# Altium footprint library ST封装.PcbLib: 1336 footprints (part 77 of 109)
Each footprint in its own frame and in the unit in brackets; x right, y up, seen from the top. Pads: shape width x height; smd on the part's side, far side on the other; paste and mask are expansions set on the pad; w line width, h text height; cw(c..) or ccw(c..) is an arc to the next point about the centre after c.
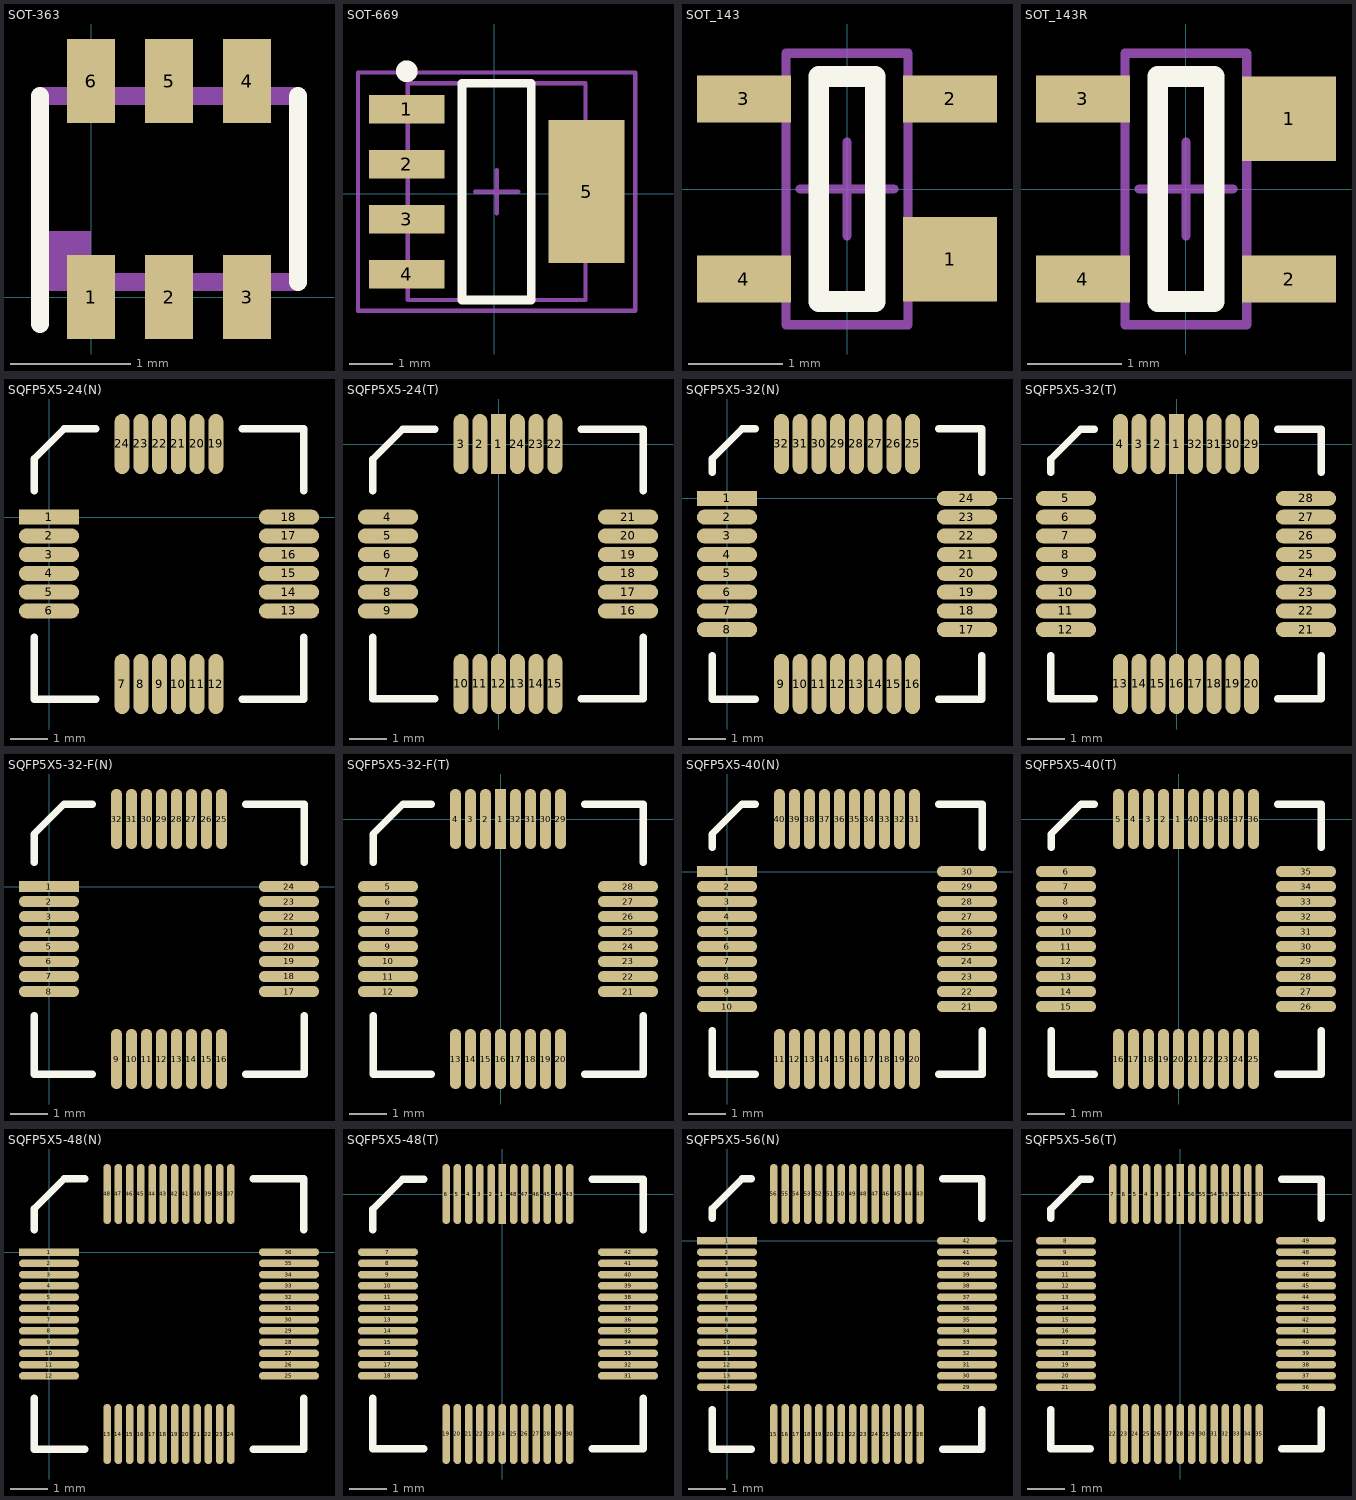
[diagram p76: the footprints below, top view; thin cyan lines are the x and y axes]

## SOT-363 [mm]
pads (6):
  rect 0.4x0.7 smd: 1(0,0) 2(0.65,0) 3(1.3,0) 4(1.3,1.8) 5(0.65,1.8) 6(0,1.8)
Top Overlay:
  lines w0.15: -0.425,-0.225 -0.425,1.675 ; 1.725,0.125 1.725,1.675
Mechanical 4:
  rectangle: -0.425,0.125 0,0.55
  lines w0.15: -0.425,0.125 -0.425,1.675 1.725,1.675 1.725,0.125 -0.425,0.125
  text ".Designator" at 0.425,1.175 h0.6

## SOT-669 [mm] "John"
pads (5):
  rect 1.75x0.65 smd: 1(-2.024,1.956) 2(-2.024,0.686) 3(-2.024,-0.584) 4(-2.024,-1.854)
  rect 1.75x3.3 smd: 5(2.126,0.051)
Top Overlay:
  circle w0.25: c-2.024,2.831 r0.125
  lines w0.2: -0.749,-2.449 0.851,-2.449 0.851,2.551 -0.749,2.551 -0.749,-2.449
Mechanical 13:
  lines w0.1: -1.999,-2.449 2.101,-2.449 2.101,2.551 -1.999,2.551 -1.999,-2.449
Mechanical 15:
  lines w0.1: -0.449,0.051 0.551,0.051 ; 0.051,-0.449 0.051,0.551 ; -3.149,-2.699 3.251,-2.699 3.251,2.801 -3.149,2.801 -3.149,-2.699
3D body "User Library-SOT669-CW.step": height 1.15, standoff -0.05, extent -2.974,-2.323 3.454,2.577

## SOT_143 [mm]
pads (4):
  rect 1x0.9 smd: 1(1.1,-0.75)
  rect 1x0.5 smd: 2(1.1,0.96) 3(-1.1,0.96) 4(-1.1,-0.96)
Top Overlay:
  lines w0.22: -0.3,-1.2 -0.3,1.2 0.3,1.2 0.3,-1.2 -0.3,-1.2
Mechanical 15:
  lines w0.1: -0.5,0 0.5,0 ; 0,-0.5 0,0.5 ; -0.65,-1.45 0.65,-1.45 0.65,1.45 -0.65,1.45 -0.65,-1.45
3D body "User Library-sot143.step": height 1, standoff 0, extent -1.22,-1.46 1.2,1.46

## SOT_143R [mm]
pads (4):
  rect 1x0.9 smd: 1(1.1,0.75)
  rect 1x0.5 smd: 2(1.1,-0.96) 3(-1.1,0.96) 4(-1.1,-0.96)
Top Overlay:
  lines w0.22: -0.3,-1.2 0.3,-1.2 0.3,1.2 -0.3,1.2 -0.3,-1.2
Mechanical 15:
  lines w0.1: -0.5,0 0.5,0 ; 0,-0.5 0,0.5 ; -0.65,-1.45 -0.65,1.45 0.65,1.45 0.65,-1.45 -0.65,-1.45
3D body "SOT-143R.STEP": height 0.95, standoff 0.02, extent -1.25,-1.45 1.25,1.45

## SQFP5X5-24(N) [mm]
pads (24):
  rect 1.6x0.4 smd: 1(0,0)
  oval 1.6x0.4 smd: 2(0,-0.5) 3(0,-1) 4(0,-1.5) 5(0,-2) 6(0,-2.5) 13(6.4,-2.5) 14(6.4,-2) 15(6.4,-1.5) 16(6.4,-1) 17(6.4,-0.5) 18(6.4,0)
  oval 0.4x1.6 smd: 7(1.95,-4.45) 8(2.45,-4.45) 9(2.95,-4.45) 10(3.45,-4.45) 11(3.95,-4.45) 12(4.45,-4.45) 19(4.45,1.95) 20(3.95,1.95) 21(3.45,1.95) 22(2.95,1.95) 23(2.45,1.95) 24(1.95,1.95)
Top Overlay:
  lines w0.2: -0.4,-3.2 -0.4,-4.85 1.25,-4.85 ; -0.4,0.7 -0.4,1.55 0.4,2.35 1.25,2.35 ; 5.15,-4.85 6.8,-4.85 6.8,-3.2 ; 5.15,2.35 6.8,2.35 6.8,0.7

## SQFP5X5-24(T) [mm]
pads (24):
  rect 0.4x1.6 smd: 1(0,0)
  oval 0.4x1.6 smd: 2(-0.5,0) 3(-1,0) 10(-1,-6.4) 11(-0.5,-6.4) 12(0,-6.4) 13(0.5,-6.4) 14(1,-6.4) 15(1.5,-6.4) 22(1.5,0) 23(1,0) 24(0.5,0)
  oval 1.6x0.4 smd: 4(-2.95,-1.95) 5(-2.95,-2.45) 6(-2.95,-2.95) 7(-2.95,-3.45) 8(-2.95,-3.95) 9(-2.95,-4.45) 16(3.45,-4.45) 17(3.45,-3.95) 18(3.45,-3.45) 19(3.45,-2.95) 20(3.45,-2.45) 21(3.45,-1.95)
Top Overlay:
  lines w0.2: -3.35,-5.15 -3.35,-6.8 -1.7,-6.8 ; -3.35,-1.25 -3.35,-0.4 -2.55,0.4 -1.7,0.4 ; 2.2,-6.8 3.85,-6.8 3.85,-5.15 ; 2.2,0.4 3.85,0.4 3.85,-1.25

## SQFP5X5-32(N) [mm]
pads (32):
  rect 1.6x0.4 smd: 1(0,0)
  oval 1.6x0.4 smd: 2(0,-0.5) 3(0,-1) 4(0,-1.5) 5(0,-2) 6(0,-2.5) 7(0,-3) 8(0,-3.5) 17(6.4,-3.5) 18(6.4,-3) 19(6.4,-2.5) 20(6.4,-2) 21(6.4,-1.5) 22(6.4,-1) 23(6.4,-0.5) 24(6.4,0)
  oval 0.4x1.6 smd: 9(1.45,-4.95) 10(1.95,-4.95) 11(2.45,-4.95) 12(2.95,-4.95) 13(3.45,-4.95) 14(3.95,-4.95) 15(4.45,-4.95) 16(4.95,-4.95) 25(4.95,1.45) 26(4.45,1.45) 27(3.95,1.45) 28(3.45,1.45) 29(2.95,1.45) 30(2.45,1.45) 31(1.95,1.45) 32(1.45,1.45)
Top Overlay:
  lines w0.2: -0.4,-4.2 -0.4,-5.35 0.75,-5.35 ; -0.4,0.7 -0.4,1.05 0.4,1.85 0.75,1.85 ; 5.65,-5.35 6.8,-5.35 6.8,-4.2 ; 5.65,1.85 6.8,1.85 6.8,0.7

## SQFP5X5-32(T) [mm]
pads (32):
  rect 0.4x1.6 smd: 1(0,0)
  oval 0.4x1.6 smd: 2(-0.5,0) 3(-1,0) 4(-1.5,0) 13(-1.5,-6.4) 14(-1,-6.4) 15(-0.5,-6.4) 16(0,-6.4) 17(0.5,-6.4) 18(1,-6.4) 19(1.5,-6.4) 20(2,-6.4) 29(2,0) 30(1.5,0) 31(1,0) 32(0.5,0)
  oval 1.6x0.4 smd: 5(-2.95,-1.45) 6(-2.95,-1.95) 7(-2.95,-2.45) 8(-2.95,-2.95) 9(-2.95,-3.45) 10(-2.95,-3.95) 11(-2.95,-4.45) 12(-2.95,-4.95) 21(3.45,-4.95) 22(3.45,-4.45) 23(3.45,-3.95) 24(3.45,-3.45) 25(3.45,-2.95) 26(3.45,-2.45) 27(3.45,-1.95) 28(3.45,-1.45)
Top Overlay:
  lines w0.2: -3.35,-5.65 -3.35,-6.8 -2.2,-6.8 ; -3.35,-0.75 -3.35,-0.4 -2.55,0.4 -2.2,0.4 ; 2.7,-6.8 3.85,-6.8 3.85,-5.65 ; 2.7,0.4 3.85,0.4 3.85,-0.75

## SQFP5X5-32-F(N) [mm]
pads (32):
  rect 1.6x0.3 smd: 1(0,0)
  oval 1.6x0.3 smd: 2(0,-0.4) 3(0,-0.8) 4(0,-1.2) 5(0,-1.6) 6(0,-2) 7(0,-2.4) 8(0,-2.8) 17(6.4,-2.8) 18(6.4,-2.4) 19(6.4,-2) 20(6.4,-1.6) 21(6.4,-1.2) 22(6.4,-0.8) 23(6.4,-0.4) 24(6.4,0)
  oval 0.3x1.6 smd: 9(1.8,-4.6) 10(2.2,-4.6) 11(2.6,-4.6) 12(3,-4.6) 13(3.4,-4.6) 14(3.8,-4.6) 15(4.2,-4.6) 16(4.6,-4.6) 25(4.6,1.8) 26(4.2,1.8) 27(3.8,1.8) 28(3.4,1.8) 29(3,1.8) 30(2.6,1.8) 31(2.2,1.8) 32(1.8,1.8)
Top Overlay:
  lines w0.2: -0.4,-3.45 -0.4,-5 1.15,-5 ; -0.4,0.65 -0.4,1.4 0.4,2.2 1.15,2.2 ; 5.25,-5 6.8,-5 6.8,-3.45 ; 5.25,2.2 6.8,2.2 6.8,0.65

## SQFP5X5-32-F(T) [mm]
pads (32):
  rect 0.3x1.6 smd: 1(0,0)
  oval 0.3x1.6 smd: 2(-0.4,0) 3(-0.8,0) 4(-1.2,0) 13(-1.2,-6.4) 14(-0.8,-6.4) 15(-0.4,-6.4) 16(0,-6.4) 17(0.4,-6.4) 18(0.8,-6.4) 19(1.2,-6.4) 20(1.6,-6.4) 29(1.6,0) 30(1.2,0) 31(0.8,0) 32(0.4,0)
  oval 1.6x0.3 smd: 5(-3,-1.8) 6(-3,-2.2) 7(-3,-2.6) 8(-3,-3) 9(-3,-3.4) 10(-3,-3.8) 11(-3,-4.2) 12(-3,-4.6) 21(3.4,-4.6) 22(3.4,-4.2) 23(3.4,-3.8) 24(3.4,-3.4) 25(3.4,-3) 26(3.4,-2.6) 27(3.4,-2.2) 28(3.4,-1.8)
Top Overlay:
  lines w0.2: -3.4,-5.25 -3.4,-6.8 -1.85,-6.8 ; -3.4,-1.15 -3.4,-0.4 -2.6,0.4 -1.85,0.4 ; 2.25,-6.8 3.8,-6.8 3.8,-5.25 ; 2.25,0.4 3.8,0.4 3.8,-1.15

## SQFP5X5-40(N) [mm]
pads (40):
  rect 1.6x0.3 smd: 1(0,0)
  oval 1.6x0.3 smd: 2(0,-0.4) 3(0,-0.8) 4(0,-1.2) 5(0,-1.6) 6(0,-2) 7(0,-2.4) 8(0,-2.8) 9(0,-3.2) 10(0,-3.6) 21(6.4,-3.6) 22(6.4,-3.2) 23(6.4,-2.8) 24(6.4,-2.4) 25(6.4,-2) 26(6.4,-1.6) 27(6.4,-1.2) 28(6.4,-0.8) 29(6.4,-0.4) 30(6.4,0)
  oval 0.3x1.6 smd: 11(1.4,-5) 12(1.8,-5) 13(2.2,-5) 14(2.6,-5) 15(3,-5) 16(3.4,-5) 17(3.8,-5) 18(4.2,-5) 19(4.6,-5) 20(5,-5) 31(5,1.4) 32(4.6,1.4) 33(4.2,1.4) 34(3.8,1.4) 35(3.4,1.4) 36(3,1.4) 37(2.6,1.4) 38(2.2,1.4) 39(1.8,1.4) 40(1.4,1.4)
Top Overlay:
  lines w0.2: -0.4,-4.25 -0.4,-5.4 0.75,-5.4 ; -0.4,0.65 -0.4,1 0.4,1.8 0.75,1.8 ; 5.65,-5.4 6.8,-5.4 6.8,-4.25 ; 5.65,1.8 6.8,1.8 6.8,0.65

## SQFP5X5-40(T) [mm]
pads (40):
  rect 0.3x1.6 smd: 1(0,0)
  oval 0.3x1.6 smd: 2(-0.4,0) 3(-0.8,0) 4(-1.2,0) 5(-1.6,0) 16(-1.6,-6.4) 17(-1.2,-6.4) 18(-0.8,-6.4) 19(-0.4,-6.4) 20(0,-6.4) 21(0.4,-6.4) 22(0.8,-6.4) 23(1.2,-6.4) 24(1.6,-6.4) 25(2,-6.4) 36(2,0) 37(1.6,0) 38(1.2,0) 39(0.8,0) 40(0.4,0)
  oval 1.6x0.3 smd: 6(-3,-1.4) 7(-3,-1.8) 8(-3,-2.2) 9(-3,-2.6) 10(-3,-3) 11(-3,-3.4) 12(-3,-3.8) 13(-3,-4.2) 14(-3,-4.6) 15(-3,-5) 26(3.4,-5) 27(3.4,-4.6) 28(3.4,-4.2) 29(3.4,-3.8) 30(3.4,-3.4) 31(3.4,-3) 32(3.4,-2.6) 33(3.4,-2.2) 34(3.4,-1.8) 35(3.4,-1.4)
Top Overlay:
  lines w0.2: -3.4,-5.65 -3.4,-6.8 -2.25,-6.8 ; -3.4,-0.75 -3.4,-0.4 -2.6,0.4 -2.25,0.4 ; 2.65,-6.8 3.8,-6.8 3.8,-5.65 ; 2.65,0.4 3.8,0.4 3.8,-0.75

## SQFP5X5-48(N) [mm]
pads (48):
  rect 1.6x0.2 smd: 1(0,0)
  oval 1.6x0.2 smd: 2(0,-0.3) 3(0,-0.6) 4(0,-0.9) 5(0,-1.2) 6(0,-1.5) 7(0,-1.8) 8(0,-2.1) 9(0,-2.4) 10(0,-2.7) 11(0,-3) 12(0,-3.3) 25(6.4,-3.3) 26(6.4,-3) 27(6.4,-2.7) 28(6.4,-2.4) 29(6.4,-2.1) 30(6.4,-1.8) 31(6.4,-1.5) 32(6.4,-1.2) 33(6.4,-0.9) 34(6.4,-0.6) 35(6.4,-0.3) 36(6.4,0)
  oval 0.2x1.6 smd: 13(1.55,-4.85) 14(1.85,-4.85) 15(2.15,-4.85) 16(2.45,-4.85) 17(2.75,-4.85) 18(3.05,-4.85) 19(3.35,-4.85) 20(3.65,-4.85) 21(3.95,-4.85) 22(4.25,-4.85) 23(4.55,-4.85) 24(4.85,-4.85) 37(4.85,1.55) 38(4.55,1.55) 39(4.25,1.55) 40(3.95,1.55) 41(3.65,1.55) 42(3.35,1.55) 43(3.05,1.55) 44(2.75,1.55) 45(2.45,1.55) 46(2.15,1.55) 47(1.85,1.55) 48(1.55,1.55)
Top Overlay:
  lines w0.2: -0.4,-3.9 -0.4,-5.25 0.95,-5.25 ; -0.4,0.6 -0.4,1.15 0.4,1.95 0.95,1.95 ; 5.45,-5.25 6.8,-5.25 6.8,-3.9 ; 5.45,1.95 6.8,1.95 6.8,0.6

## SQFP5X5-48(T) [mm]
pads (48):
  rect 0.2x1.6 smd: 1(0,0)
  oval 0.2x1.6 smd: 2(-0.3,0) 3(-0.6,0) 4(-0.9,0) 5(-1.2,0) 6(-1.5,0) 19(-1.5,-6.4) 20(-1.2,-6.4) 21(-0.9,-6.4) 22(-0.6,-6.4) 23(-0.3,-6.4) 24(0,-6.4) 25(0.3,-6.4) 26(0.6,-6.4) 27(0.9,-6.4) 28(1.2,-6.4) 29(1.5,-6.4) 30(1.8,-6.4) 43(1.8,0) 44(1.5,0) 45(1.2,0) 46(0.9,0) 47(0.6,0) 48(0.3,0)
  oval 1.6x0.2 smd: 7(-3.05,-1.55) 8(-3.05,-1.85) 9(-3.05,-2.15) 10(-3.05,-2.45) 11(-3.05,-2.75) 12(-3.05,-3.05) 13(-3.05,-3.35) 14(-3.05,-3.65) 15(-3.05,-3.95) 16(-3.05,-4.25) 17(-3.05,-4.55) 18(-3.05,-4.85) 31(3.35,-4.85) 32(3.35,-4.55) 33(3.35,-4.25) 34(3.35,-3.95) 35(3.35,-3.65) 36(3.35,-3.35) 37(3.35,-3.05) 38(3.35,-2.75) 39(3.35,-2.45) 40(3.35,-2.15) 41(3.35,-1.85) 42(3.35,-1.55)
Top Overlay:
  lines w0.2: -3.45,-5.45 -3.45,-6.8 -2.1,-6.8 ; -3.45,-0.95 -3.45,-0.4 -2.65,0.4 -2.1,0.4 ; 2.4,-6.8 3.75,-6.8 3.75,-5.45 ; 2.4,0.4 3.75,0.4 3.75,-0.95

## SQFP5X5-56(N) [mm]
pads (56):
  rect 1.6x0.2 smd: 1(0,0)
  oval 1.6x0.2 smd: 2(0,-0.3) 3(0,-0.6) 4(0,-0.9) 5(0,-1.2) 6(0,-1.5) 7(0,-1.8) 8(0,-2.1) 9(0,-2.4) 10(0,-2.7) 11(0,-3) 12(0,-3.3) 13(0,-3.6) 14(0,-3.9) 29(6.4,-3.9) 30(6.4,-3.6) 31(6.4,-3.3) 32(6.4,-3) 33(6.4,-2.7) 34(6.4,-2.4) 35(6.4,-2.1) 36(6.4,-1.8) 37(6.4,-1.5) 38(6.4,-1.2) 39(6.4,-0.9) 40(6.4,-0.6) 41(6.4,-0.3) 42(6.4,0)
  oval 0.2x1.6 smd: 15(1.25,-5.15) 16(1.55,-5.15) 17(1.85,-5.15) 18(2.15,-5.15) 19(2.45,-5.15) 20(2.75,-5.15) 21(3.05,-5.15) 22(3.35,-5.15) 23(3.65,-5.15) 24(3.95,-5.15) 25(4.25,-5.15) 26(4.55,-5.15) 27(4.85,-5.15) 28(5.15,-5.15) 43(5.15,1.25) 44(4.85,1.25) 45(4.55,1.25) 46(4.25,1.25) 47(3.95,1.25) 48(3.65,1.25) 49(3.35,1.25) 50(3.05,1.25) 51(2.75,1.25) 52(2.45,1.25) 53(2.15,1.25) 54(1.85,1.25) 55(1.55,1.25) 56(1.25,1.25)
Top Overlay:
  lines w0.2: -0.4,-4.5 -0.4,-5.55 0.65,-5.55 ; -0.4,0.6 -0.4,0.85 0.4,1.65 0.65,1.65 ; 5.75,-5.55 6.8,-5.55 6.8,-4.5 ; 5.75,1.65 6.8,1.65 6.8,0.6

## SQFP5X5-56(T) [mm]
pads (56):
  rect 0.2x1.6 smd: 1(0,0)
  oval 0.2x1.6 smd: 2(-0.3,0) 3(-0.6,0) 4(-0.9,0) 5(-1.2,0) 6(-1.5,0) 7(-1.8,0) 22(-1.8,-6.4) 23(-1.5,-6.4) 24(-1.2,-6.4) 25(-0.9,-6.4) 26(-0.6,-6.4) 27(-0.3,-6.4) 28(0,-6.4) 29(0.3,-6.4) 30(0.6,-6.4) 31(0.9,-6.4) 32(1.2,-6.4) 33(1.5,-6.4) 34(1.8,-6.4) 35(2.1,-6.4) 50(2.1,0) 51(1.8,0) 52(1.5,0) 53(1.2,0) 54(0.9,0) 55(0.6,0) 56(0.3,0)
  oval 1.6x0.2 smd: 8(-3.05,-1.25) 9(-3.05,-1.55) 10(-3.05,-1.85) 11(-3.05,-2.15) 12(-3.05,-2.45) 13(-3.05,-2.75) 14(-3.05,-3.05) 15(-3.05,-3.35) 16(-3.05,-3.65) 17(-3.05,-3.95) 18(-3.05,-4.25) 19(-3.05,-4.55) 20(-3.05,-4.85) 21(-3.05,-5.15) 36(3.35,-5.15) 37(3.35,-4.85) 38(3.35,-4.55) 39(3.35,-4.25) 40(3.35,-3.95) 41(3.35,-3.65) 42(3.35,-3.35) 43(3.35,-3.05) 44(3.35,-2.75) 45(3.35,-2.45) 46(3.35,-2.15) 47(3.35,-1.85) 48(3.35,-1.55) 49(3.35,-1.25)
Top Overlay:
  lines w0.2: -3.45,-5.75 -3.45,-6.8 -2.4,-6.8 ; -3.45,-0.65 -3.45,-0.4 -2.65,0.4 -2.4,0.4 ; 2.7,-6.8 3.75,-6.8 3.75,-5.75 ; 2.7,0.4 3.75,0.4 3.75,-0.65